# Altium footprint library Vowstar_IC_General.PcbLib: 139 footprints (part 2 of 9)
Each footprint in its own frame and in the unit in brackets; x right, y up, seen from the top. Pads: shape width x height; smd on the part's side, far side on the other; paste and mask are expansions set on the pad; w line width, h text height; cw(c..) or ccw(c..) is an arc to the next point about the centre after c.
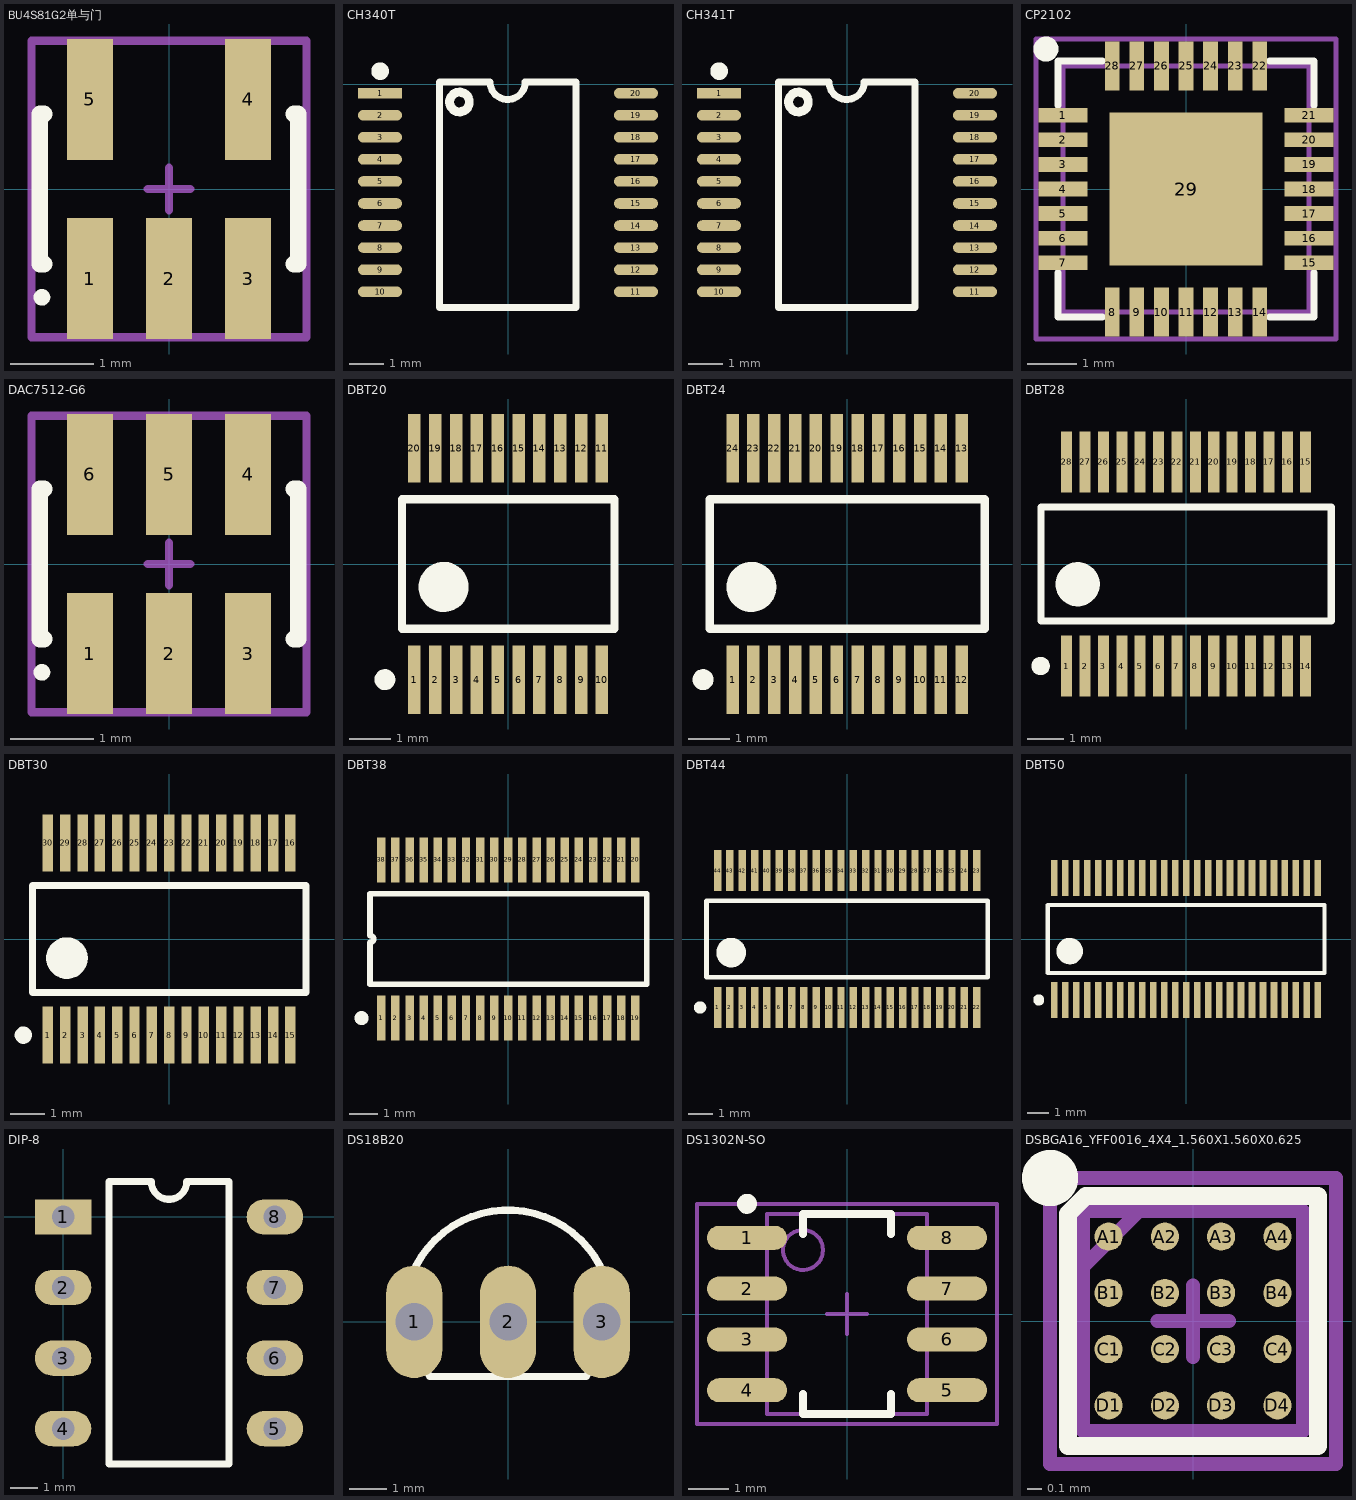
[diagram p1: the footprints below, top view; thin cyan lines are the x and y axes]

## BU4S81G2单与门 [mm] "BU4S81G2单与门"
height 1.25
pads (5):
  rect 0.55x1.45 smd: 1(-0.95,-1.075) 2(0,-1.075) 3(0.95,-1.075) 4(0.95,1.075) 5(-0.95,1.075)
Top Overlay:
  circle w0.1: c-1.525,-1.3 r0.05
  lines w0.2: -1.5,-0.9 -1.55,-0.9 -1.55,0.9 -1.5,0.9 ; 1.5,-0.9 1.55,-0.9 1.55,0.9 1.5,0.9
Mechanical 15:
  lines w0.1: -0.254,0 0.254,0 ; 0,-0.254 0,0.254 ; -1.651,-1.778 -1.651,1.778 1.651,1.778 1.651,-1.778 -1.651,-1.778
3D body "User Library-SOT23-5.step": height 1.45, standoff 0, extent -1.448,-1.397 1.452,1.403

## CH340T [mil]
height 100
pads (20):
  rect 50x12 smd: 1(-145,-10)
  oval 50x12 smd: 2(-145,-35) 3(-145,-60) 4(-145,-85) 5(-145,-110) 6(-145,-135) 7(-145,-160) 8(-145,-185) 9(-145,-210) 10(-145,-235) 11(145,-235) 12(145,-210) 13(145,-185) 14(145,-160) 15(145,-135) 16(145,-110) 17(145,-85) 18(145,-60) 19(145,-35) 20(145,-10)
Top Overlay:
  circle w10: c-145,15 r5
  circle w10: c-55,-20 r11.18
  lines w7.87: -21,2.79 -77.76,2.79 -77.76,-253.11 76.97,-253.11 76.97,2.79 19,2.79 ; -20.39,2.8 ccw(c-0.39,2.79) 19.61,2.79
3D body: height 60, standoff 20, extent -75,-250 75,5

## CH341T [mil]
height 100
pads (20):
  rect 50x12 smd: 1(-145,-10)
  oval 50x12 smd: 2(-145,-35) 3(-145,-60) 4(-145,-85) 5(-145,-110) 6(-145,-135) 7(-145,-160) 8(-145,-185) 9(-145,-210) 10(-145,-235) 11(145,-235) 12(145,-210) 13(145,-185) 14(145,-160) 15(145,-135) 16(145,-110) 17(145,-85) 18(145,-60) 19(145,-35) 20(145,-10)
Top Overlay:
  circle w10: c-145,15 r5
  circle w10: c-55,-20 r11.18
  lines w7.87: -21,2.79 -77.76,2.79 -77.76,-253.11 76.97,-253.11 76.97,2.79 19,2.79 ; -20.39,2.8 ccw(c-0.39,2.79) 19.61,2.79
3D body: height 60, standoff 20, extent -75,-250 75,5

## CP2102 [mm] "CP2102"
height 1
pads (29):
  rect 1x0.3 smd: 1(-2.5,1.5) 2(-2.5,1) 3(-2.5,0.5) 4(-2.5,0) 5(-2.5,-0.5) 6(-2.5,-1) 7(-2.5,-1.5) 15(2.5,-1.5) 16(2.5,-1) 17(2.5,-0.5) 18(2.5,0) 19(2.5,0.5) 20(2.5,1) 21(2.5,1.5)
  rect 0.3x1 smd: 8(-1.5,-2.5) 9(-1,-2.5) 10(-0.5,-2.5) 11(0,-2.5) 12(0.5,-2.5) 13(1,-2.5) 14(1.5,-2.5) 22(1.5,2.5) 23(1,2.5) 24(0.5,2.5) 25(0,2.5) 26(-0.5,2.5) 27(-1,2.5) 28(-1.5,2.5)
  rect 3.1x3.1 smd paste-3.2: 29(0,0)
Top Overlay:
  circle w0.254: c-2.844,2.844 r0.127
  lines w0.15: -2.6,-1.7 -2.6,-2.6 -1.7,-2.6 ; -2.6,1.7 -2.6,2.6 ; -2.591,2.6 -1.7,2.6 ; 1.7,-2.6 2.6,-2.6 2.6,-1.7 ; 1.7,2.6 2.6,2.6 2.6,1.7
Top Paste:
  region: 1.524,-0.381 1.524,0.381 0.762,0.381 0.762,-0.381
  region: -0.762,-0.381 -0.762,0.381 -1.524,0.381 -1.524,-0.381
  region: 0.381,-0.381 0.381,0.381 -0.381,0.381 -0.381,-0.381
  region: 1.524,-1.524 1.524,-0.762 0.762,-0.762 0.762,-1.524
  region: 0.381,-1.524 0.381,-0.762 -0.381,-0.762 -0.381,-1.524
  region: -1.524,-1.524 -0.762,-1.524 -0.762,-0.762 -1.524,-0.762
  region: -1.524,0.762 -0.762,0.762 -0.762,1.524 -1.524,1.524
  region: -0.381,1.524 -0.381,0.762 0.381,0.762 0.381,1.524
  region: 0.762,1.524 0.762,0.762 1.524,0.762 1.524,1.524
Mechanical 13:
  lines w0.1: -2.5,-2.5 2.5,-2.5 2.5,2.5 -2.5,2.5 -2.5,-2.5
Mechanical 15:
  lines w0.1: -0.5,0 0.5,0 ; 0,-0.5 0,0.5 ; -3.048,-3.048 3.048,-3.048 3.048,3.048 -3.048,3.048 -3.048,-3.048
3D body "User Library-QFN-28-0_5.STEP": height 1, standoff 0, extent -2.5,-2.5 2.5,2.5

## DAC7512-G6 [mm] "DAC7512-G6"
height 1.25
pads (6):
  rect 0.55x1.45 smd: 1(-0.95,-1.075) 2(0,-1.075) 3(0.95,-1.075) 4(0.95,1.075) 5(0,1.075) 6(-0.95,1.075)
Top Overlay:
  circle w0.1: c-1.525,-1.3 r0.05
  lines w0.2: -1.5,-0.9 -1.55,-0.9 -1.55,0.9 -1.5,0.9 ; 1.5,-0.9 1.55,-0.9 1.55,0.9 1.5,0.9
Mechanical 15:
  lines w0.1: -0.254,0 0.254,0 ; 0,-0.254 0,0.254 ; -1.651,-1.778 -1.651,1.778 1.651,1.778 1.651,-1.778 -1.651,-1.778
3D body "User Library-SOT23-6.step": height 1.45, standoff 0, extent -1.448,-1.4 1.452,1.4

## DBT20 [mm] "Shrink Small Outline; 20 Leads; Body Width 4.4 mm; Pitch 0.5 mm"
height 1.2
pads (20):
  rect 0.3x1.65 smd: 1(-2.25,-2.775) 2(-1.75,-2.775) 3(-1.25,-2.775) 4(-0.75,-2.775) 5(-0.25,-2.775) 6(0.25,-2.775) 7(0.75,-2.775) 8(1.25,-2.775) 9(1.75,-2.775) 10(2.25,-2.775) 11(2.25,2.775) 12(1.75,2.775) 13(1.25,2.775) 14(0.75,2.775) 15(0.25,2.775) 16(-0.25,2.775) 17(-0.75,2.775) 18(-1.25,2.775) 19(-1.75,2.775) 20(-2.25,2.775)
Top Overlay:
  circle w0.6: c-1.55,-0.55 r0.3
  circle w0.25: c-2.96,-2.775 r0.125
  lines w0.2: -2.55,-1.55 2.55,-1.55 2.55,1.55 -2.55,1.55 -2.55,-0.517 -2.55,-1.55

## DBT24 [mm] "Shrink Small Outline; 24 Leads; Body Width 4.4 mm; Pitch 0.5 mm"
height 1.2
pads (24):
  rect 0.3x1.65 smd: 1(-2.75,-2.775) 2(-2.25,-2.775) 3(-1.75,-2.775) 4(-1.25,-2.775) 5(-0.75,-2.775) 6(-0.25,-2.775) 7(0.25,-2.775) 8(0.75,-2.775) 9(1.25,-2.775) 10(1.75,-2.775) 11(2.25,-2.775) 12(2.75,-2.775) 13(2.75,2.775) 14(2.25,2.775) 15(1.75,2.775) 16(1.25,2.775) 17(0.75,2.775) 18(0.25,2.775) 19(-0.25,2.775) 20(-0.75,2.775) 21(-1.25,2.775) 22(-1.75,2.775) 23(-2.25,2.775) 24(-2.75,2.775)
Top Overlay:
  circle w0.6: c-2.3,-0.55 r0.3
  circle w0.25: c-3.46,-2.775 r0.125
  lines w0.2: -3.3,-1.55 3.3,-1.55 3.3,1.55 -3.3,1.55 -3.3,-0.517 -3.3,-1.55

## DBT28 [mm] "Shrink Small Outline; 28 Leads; Body Width 4.4 mm; Pitch 0.5 mm"
height 1.2
pads (28):
  rect 0.3x1.65 smd: 1(-3.25,-2.775) 2(-2.75,-2.775) 3(-2.25,-2.775) 4(-1.75,-2.775) 5(-1.25,-2.775) 6(-0.75,-2.775) 7(-0.25,-2.775) 8(0.25,-2.775) 9(0.75,-2.775) 10(1.25,-2.775) 11(1.75,-2.775) 12(2.25,-2.775) 13(2.75,-2.775) 14(3.25,-2.775) 15(3.25,2.775) 16(2.75,2.775) 17(2.25,2.775) 18(1.75,2.775) 19(1.25,2.775) 20(0.75,2.775) 21(0.25,2.775) 22(-0.25,2.775) 23(-0.75,2.775) 24(-1.25,2.775) 25(-1.75,2.775) 26(-2.25,2.775) 27(-2.75,2.775) 28(-3.25,2.775)
Top Overlay:
  circle w0.6: c-2.95,-0.55 r0.3
  circle w0.25: c-3.96,-2.775 r0.125
  lines w0.2: -3.95,-1.55 3.95,-1.55 3.95,1.55 -3.95,1.55 -3.95,-0.517 -3.95,-1.55

## DBT30 [mm] "Shrink Small Outline; 30 Leads; Body Width 4.4 mm; Pitch 0.5 mm"
height 1.2
pads (30):
  rect 0.3x1.65 smd: 1(-3.5,-2.775) 2(-3,-2.775) 3(-2.5,-2.775) 4(-2,-2.775) 5(-1.5,-2.775) 6(-1,-2.775) 7(-0.5,-2.775) 8(0,-2.775) 9(0.5,-2.775) 10(1,-2.775) 11(1.5,-2.775) 12(2,-2.775) 13(2.5,-2.775) 14(3,-2.775) 15(3.5,-2.775) 16(3.5,2.775) 17(3,2.775) 18(2.5,2.775) 19(2,2.775) 20(1.5,2.775) 21(1,2.775) 22(0.5,2.775) 23(0,2.775) 24(-0.5,2.775) 25(-1,2.775) 26(-1.5,2.775) 27(-2,2.775) 28(-2.5,2.775) 29(-3,2.775) 30(-3.5,2.775)
Top Overlay:
  circle w0.6: c-2.95,-0.55 r0.3
  circle w0.25: c-4.21,-2.775 r0.125
  lines w0.2: -3.95,-1.55 3.95,-1.55 3.95,1.55 -3.95,1.55 -3.95,-0.517 -3.95,-1.55

## DBT38 [mm] "Shrink Small Outline; 38 Leads; Body Width 4.4 mm; Pitch 0.5 mm"
height 1.2
pads (38):
  rect 0.3x1.6 smd: 1(-4.5,-2.8) 2(-4,-2.8) 3(-3.5,-2.8) 4(-3,-2.8) 5(-2.5,-2.8) 6(-2,-2.8) 7(-1.5,-2.8) 8(-1,-2.8) 9(-0.5,-2.8) 10(0,-2.8) 11(0.5,-2.8) 12(1,-2.8) 13(1.5,-2.8) 14(2,-2.8) 15(2.5,-2.8) 16(3,-2.8) 17(3.5,-2.8) 18(4,-2.8) 19(4.5,-2.8) 20(4.5,2.8) 21(4,2.8) 22(3.5,2.8) 23(3,2.8) 24(2.5,2.8) 25(2,2.8) 26(1.5,2.8) 27(1,2.8) 28(0.5,2.8) 29(0,2.8) 30(-0.5,2.8) 31(-1,2.8) 32(-1.5,2.8) 33(-2,2.8) 34(-2.5,2.8) 35(-3,2.8) 36(-3.5,2.8) 37(-4,2.8) 38(-4.5,2.8)
Top Overlay:
  circle w0.25: c-5.2,-2.8 r0.125
  lines w0.2: -4.9,-1.6 -4.9,-0.125 ccw(c-4.9,0) -4.9,0.125 -4.9,1.6 4.9,1.6 4.9,-1.6 -4.9,-1.6

## DBT44 [mm] "Shrink Small Outline; 44 Leads; Body Width 4.4 mm; Pitch 0.5 mm"
height 1.2
pads (44):
  rect 0.3x1.65 smd: 1(-5.25,-2.775) 2(-4.75,-2.775) 3(-4.25,-2.775) 4(-3.75,-2.775) 5(-3.25,-2.775) 6(-2.75,-2.775) 7(-2.25,-2.775) 8(-1.75,-2.775) 9(-1.25,-2.775) 10(-0.75,-2.775) 11(-0.25,-2.775) 12(0.25,-2.775) 13(0.75,-2.775) 14(1.25,-2.775) 15(1.75,-2.775) 16(2.25,-2.775) 17(2.75,-2.775) 18(3.25,-2.775) 19(3.75,-2.775) 20(4.25,-2.775) 21(4.75,-2.775) 22(5.25,-2.775) 23(5.25,2.775) 24(4.75,2.775) 25(4.25,2.775) 26(3.75,2.775) 27(3.25,2.775) 28(2.75,2.775) 29(2.25,2.775) 30(1.75,2.775) 31(1.25,2.775) 32(0.75,2.775) 33(0.25,2.775) 34(-0.25,2.775) 35(-0.75,2.775) 36(-1.25,2.775) 37(-1.75,2.775) 38(-2.25,2.775) 39(-2.75,2.775) 40(-3.25,2.775) 41(-3.75,2.775) 42(-4.25,2.775) 43(-4.75,2.775) 44(-5.25,2.775)
Top Overlay:
  circle w0.25: c-5.96,-2.775 r0.125
  circle w0.6: c-4.7,-0.55 r0.3
  lines w0.2: -5.7,-1.55 -5.7,-0.517 -5.7,1.55 5.7,1.55 5.7,-1.55 -5.7,-1.55

## DBT50 [mm] "Shrink Small Outline; 50 Leads; Body Width 4.4 mm; Pitch 0.5 mm"
height 1.2
pads (50):
  rect 0.3x1.65 smd: 1(-6,-2.775) 2(-5.5,-2.775) 3(-5,-2.775) 4(-4.5,-2.775) 5(-4,-2.775) 6(-3.5,-2.775) 7(-3,-2.775) 8(-2.5,-2.775) 9(-2,-2.775) 10(-1.5,-2.775) 11(-1,-2.775) 12(-0.5,-2.775) 13(0,-2.775) 14(0.5,-2.775) 15(1,-2.775) 16(1.5,-2.775) 17(2,-2.775) 18(2.5,-2.775) 19(3,-2.775) 20(3.5,-2.775) 21(4,-2.775) 22(4.5,-2.775) 23(5,-2.775) 24(5.5,-2.775) 25(6,-2.775) 26(6,2.775) 27(5.5,2.775) 28(5,2.775) 29(4.5,2.775) 30(4,2.775) 31(3.5,2.775) 32(3,2.775) 33(2.5,2.775) 34(2,2.775) 35(1.5,2.775) 36(1,2.775) 37(0.5,2.775) 38(0,2.775) 39(-0.5,2.775) 40(-1,2.775) 41(-1.5,2.775) 42(-2,2.775) 43(-2.5,2.775) 44(-3,2.775) 45(-3.5,2.775) 46(-4,2.775) 47(-4.5,2.775) 48(-5,2.775) 49(-5.5,2.775) 50(-6,2.775)
Top Overlay:
  circle w0.25: c-6.71,-2.775 r0.125
  circle w0.6: c-5.3,-0.55 r0.3
  lines w0.2: -6.3,-1.55 -6.3,-0.517 -6.3,1.55 6.3,1.55 6.3,-1.55 -6.3,-1.55

## DIP-8 [mil] "DIP8封装，100mil间距，300mil引脚宽度"
height 100
pads (8):
  rect 80x50 hole 32: 1(0,0)
  oval 80x50 hole 32: 2(0,-100) 3(0,-200) 4(0,-300) 5(300,-300) 6(300,-200) 7(300,-100) 8(300,0)
Top Overlay:
  lines w10: 65,-350 235,-350 235,50 175,50 cw(c150,50) 125,50 65,50 65,-350
3D body "User Library-DIP-8-300-metric.step": height 177.17, standoff -137.8, extent -3,-362.6 302.54,62.6

## DS18B20 [mil] "DS18B20"
pads (3):
  oval 60x120 hole 40: 1(-100,0) 2(0,0) 3(100,0)
Top Overlay:
  lines w7.87: -102.76,49.85 cw(c0,8.33) 102.76,49.85 ; -89.08,-49.71 -83.33,-58.33 83.33,-58.33 89.08,-49.71
3D body "User Library-TO-92 (TO-226) Bent Lead.STEP": height 393.7, standoff -118.11, extent -109.84,-60.5 109.84,105

## DS1302N-SO [mm] "DS1302N-SO"
pads (8):
  oval 2x0.6 smd: 1(-2.5,1.905) 2(-2.5,0.635) 3(-2.5,-0.635) 4(-2.5,-1.905) 5(2.5,-1.905) 6(2.5,-0.635) 7(2.5,0.635) 8(2.5,1.905)
Top Overlay:
  circle w0.25: c-2.5,2.755 r0.125
  lines w0.2: -1.1,-2 -1.1,-2.5 1.1,-2.5 1.1,-2 ; -1.1,2 -1.1,2.5 1.1,2.5 1.1,2
Mechanical 13:
  circle w0.1: c-1.1,1.6 r0.5
  lines w0.1: -2,-2.5 2,-2.5 2,2.5 -2,2.5 -2,-2.5
Mechanical 15:
  lines w0.1: -0.5,0 0.5,0 ; 0,-0.5 0,0.5 ; -3.75,-2.75 3.75,-2.75 3.75,2.75 -3.75,2.75 -3.75,-2.75
3D body "User Library-SOP-8.step": height 1.45, standoff 0, extent -2.921,-2.451 2.857,2.451

## DSBGA16_YFF0016_4X4_1.560X1.560X0.625 [mm] "DSBGA16 YFF0016 4x4 ball grid, 1.560x1.560x0.625mm, DIE SIZE BALL GRID ARRAY"
height 0.625
pads (16):
  round 0.2 smd: A1(-0.6,0.6) A2(-0.2,0.6) A3(0.2,0.6) A4(0.6,0.6) B1(-0.6,0.2) B2(-0.2,0.2) B3(0.2,0.2) B4(0.6,0.2) C1(-0.6,-0.2) C2(-0.2,-0.2) C3(0.2,-0.2) C4(0.6,-0.2) D1(-0.6,-0.6) D2(-0.2,-0.6) D3(0.2,-0.6) D4(0.6,-0.6)
Top Overlay:
  circle w0.2: c-1.016,1.016 r0.1
  lines w0.127: -0.889,-0.889 0.889,-0.889 0.889,0.889 -0.762,0.889 -0.889,0.762 -0.889,-0.889
Mechanical 13:
  lines w0.1: -0.781,0.383 -0.383,0.781 ; -0.781,-0.781 -0.781,0.781 0.781,0.781 0.781,-0.781 -0.781,-0.781
Mechanical 15:
  lines w0.1: -0.254,0 0.254,0 ; 0,-0.254 0,0.254 ; -1.016,-1.016 -1.016,1.016 1.016,1.016 1.016,-1.016 -1.016,-1.016
3D body "TMP468.stp": height 0.63, standoff 0, extent -0.781,-0.781 0.781,0.781